# Altium footprint library 元件1.PcbLib: 420 footprints (part 11 of 27)
Each footprint in its own frame and in the unit in brackets; x right, y up, seen from the top. Pads: shape width x height; smd on the part's side, far side on the other; paste and mask are expansions set on the pad; w line width, h text height; cw(c..) or ccw(c..) is an arc to the next point about the centre after c.
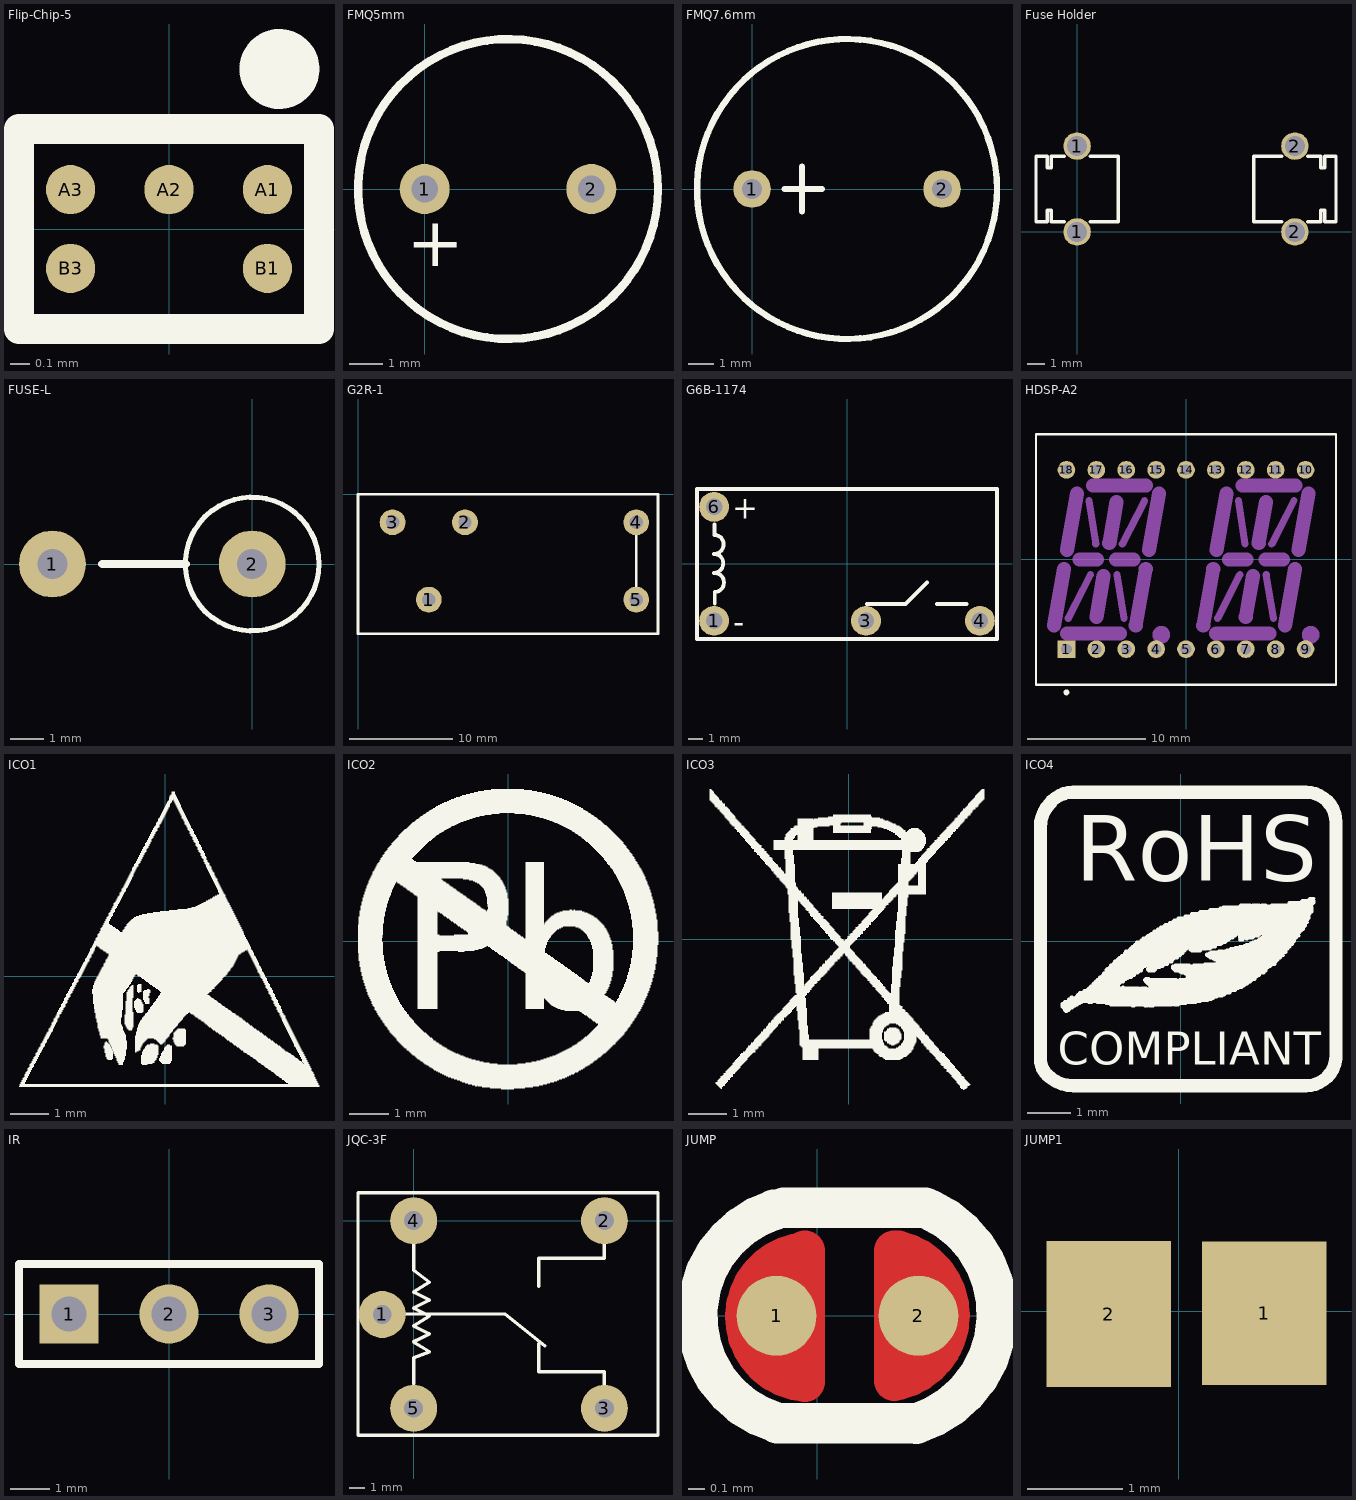
[diagram p10: the footprints below, top view; thin cyan lines are the x and y axes]

## Flip-Chip-5 [mm]
height 0.69
pads (5):
  round 0.25 smd mask+0.05: A1(0.5,0.2) A2(0,0.2) A3(-0.5,0.2) B1(0.5,-0.2) B3(-0.5,-0.2)
Top Overlay:
  circle w0.203: c0.561,0.813 r0.102
  lines w0.152: -0.762,-0.508 -0.762,0.508 0.762,0.508 0.762,-0.508 -0.762,-0.508
3D body "FlipChip-5.STEP": height 0.69, standoff 0, extent -0.693,-0.425 0.693,0.43

## FMQ5mm [mm]
pads (2):
  round 1.5 hole 0.8: 1(0,0) 2(5,0)
Top Overlay:
  circle w0.254: c2.5,0 r4.5
  text "+" at -0.533,-2.311 h1.5
3D body "cst-951ap.stp": height 4.5, standoff -4.5, extent -2,-4.5 7,4.5

## FMQ7.6mm [mm]
pads (2):
  round 1.5 hole 0.8: 1(0,0) 2(7.6,0)
Top Overlay:
  circle w0.254: c3.799,0 r6.001
  lines w0.254: 1.3,0 2.8,0 ; 2,-0.9 2,0.9
3D body "User Library-WST-1203UX.STEP": height 9.65, standoff -4.5, extent -5.727,-6 9.727,6

## Fuse Holder [mm]
pads (4):
  round 1.6 hole 1.17 mask+0.06: 1(0,0) 1(0,5) 2(12.7,0) 2(12.7,5)
Top Overlay:
  lines w0.2: -0.75,0.6 -1.5,0.6 -1.5,1.25 -1.75,1.25 -1.75,0.6 -2.4,0.6 -2.4,4.4 -1.75,4.4 -1.75,3.75 -1.5,3.75 -1.5,4.4 -0.75,4.4 ; 0.75,0.6 2.4,0.6 2.4,4.4 0.75,4.4 ; 11.95,0.6 10.3,0.6 10.3,4.4 11.95,4.4 ; 13.45,0.6 14.2,0.6 14.2,1.25 14.45,1.25 14.45,0.6 15.1,0.6 15.1,4.4 14.45,4.4 14.45,3.75 14.2,3.75 14.2,4.4 13.45,4.4
3D body "User Library-01110501Z.STEP": height 7.4, standoff -2.95, extent 10.325,0 15.125,5.1
3D body "User Library-01110501Z.STEP": height 7.4, standoff -2.95, extent -2.275,0 2.525,5.1

## FUSE-L [mil]
height 511.81
pads (2):
  round 79 hole 35.43: 1(-236.22,0) 2(0,0)
Top Overlay:
  circle w6: c0,0 r79
  lines w10: -177.17,0 -78.74,0
3D body "保险.": height 545.04, standoff -77.66, extent -249.02,-74.21 77.68,83.27

## G2R-1 [mm]
pads (5):
  round 2.5 hole 1.3: 1(6.858,-10.211) 2(10.363,-2.718) 3(3.353,-2.718) 4(26.949,-2.718) 5(26.949,-10.211)
Top Overlay:
  lines w0.254: 26.949,-10.211 26.949,-2.718 ; 0,-13.513 29.058,-13.513 29.058,0 0,0 0,-13.513
3D body "relay_g2rk-1_48dc.stp": height 25.5, standoff -4, extent 0.079,-13.583 29.08,-0.083

## G6B-1174 [mm]
pads (4):
  round 2 hole 1.1: 1(-8.89,-3.81) 3(1.27,-3.81) 4(8.89,-3.81) 6(-8.89,3.81)
Top Overlay:
  lines w0.254: -8.915,-0.61 ccw(c-8.915,0.025) -8.28,0.025 -8.28,0.051 ccw(c-8.89,0.051) -8.89,0.66 ccw(c-8.89,1.295) -8.255,1.295 -8.255,1.321 ccw(c-8.865,1.321) -8.865,1.93 -8.865,2.642 ; -8.865,-0.61 cw(c-8.865,-1.245) -8.23,-1.245 -8.23,-1.27 cw(c-8.839,-1.27) -8.839,-1.88 -8.839,-2.667 ; 1.346,-2.692 3.912,-2.692 5.359,-1.245 ; 6.02,-2.692 8.001,-2.692 ; -10.033,-5.029 10.033,-5.029 10.033,5.004 -10.033,5.004 -10.033,-5.029
  text "+" at -7.671,3.023 h1.52
  text "-" at -7.62,-4.648 h1.52
3D body "g6b-1114p-us_5dc.stp": height 10, standoff -3.2, extent -10.474,-5 10.526,5

## HDSP-A2 [mm] "LED, Alphanumeric Display, 13.8 mm, Dual Character; 18 Leads; Row Space 15.24 mm; Pitch 2.54 mm"
height 7.27
pads (18):
  rect 1.5x1.5 hole 0.9: 1(-10.16,-7.62)
  round 1.5 hole 0.9: 2(-7.62,-7.62) 3(-5.08,-7.62) 4(-2.54,-7.62) 5(0,-7.62) 6(2.54,-7.62) 7(5.08,-7.62) 8(7.62,-7.62) 9(10.16,-7.62) 10(10.16,7.62) 11(7.62,7.62) 12(5.08,7.62) 13(2.54,7.62) 14(0,7.62) 15(-2.54,7.62) 16(-5.08,7.62) 17(-7.62,7.62) 18(-10.16,7.62)
Top Overlay:
  circle w0.25: c-10.16,-11.3 r0.125
  lines w0.2: -12.75,-10.65 -12.75,10.65 12.75,10.65 12.75,-10.65 -12.75,-10.65
Mechanical 2:
  circle w1.2: c10.6,-6.4 r0.15
  circle w1.2: c-2.1,-6.4 r0.15
  lines w0.6: -10.01,-5 -8.12,-1.3 ; -8.25,5 -7.67,1.3 ; -5.88,-1.3 -5.28,-5 ; -5.42,1.3 -3.52,5 ; 2.69,-5 4.58,-1.3 ; 4.45,5 5.03,1.3 ; 6.82,-1.3 7.42,-5 ; 7.28,1.3 9.18,5
  lines w1.2: -11.23,-5.6 -10.38,-0.8 ; -10.13,-6.3 -5.62,-6.3 ; -10.1,0.8 -9.26,5.58 ; -9.035,0 -7.58,0 ; -7.9,6.3 -3.39,6.3 ; -7.62,-4.89 -7.01,-1.4 ; -6.52,1.41 -5.91,4.89 ; -5.96,0 -4.465,0 ; -4.27,-5.6 -3.42,-0.8 ; -3.13,0.81 -2.3,5.59 ; 1.47,-5.6 2.32,-0.8 ; 2.57,-6.3 7.08,-6.3 ; 2.6,0.8 3.44,5.58 ; 3.665,0 5.14,0 ; 4.8,6.3 9.31,6.3 ; 5.08,-4.89 5.69,-1.4 ; 6.18,1.41 6.79,4.89 ; 6.76,0 8.235,0 ; 8.43,-5.6 9.28,-0.8 ; 9.57,0.81 10.4,5.59
3D body "HDSP-A2.STEP": height 10, standoff 0, extent -12.164,-9.373 11.836,9.627

## ICO1 [mm]
Top Overlay:
  drawing of 990 lines, arcs and shapes, not listed

## ICO2 [mm]
Top Overlay:
  drawing of 960 lines, arcs and shapes, not listed

## ICO3 [mm]
Top Overlay:
  drawing of 1026 lines, arcs and shapes, not listed

## ICO4 [mm]
Top Overlay:
  drawing of 1541 lines, arcs and shapes, not listed
  text "COMPLIANT" at -2.845,-2.869 h0.76
  text "RoHS" at -2.438,1.398 h1.52

## IR [mm]
pads (3):
  rect 1.5x1.5 hole 0.9: 1(-2.54,0)
  round 1.5 hole 0.9: 2(0,0) 3(2.54,0)
Top Overlay:
  lines w0.2: -3.81,-1.27 -3.81,1.27 3.81,1.27 3.81,-1.27 -3.81,-1.27
3D body "User Library-IR reciver.STEP": height 10.48, standoff -2.63, extent -3.025,-3.997 2.975,3.789

## JQC-3F [mm]
pads (5):
  round 3 hole 1.2: 1(-2,-6) 2(12.2,0) 3(12.2,-12) 4(0,0) 5(0,-12)
Top Overlay:
  lines w0.22: -0.508,-5.969 5.842,-5.969 8.382,-8.001 ; 0,-10.414 0,-8.763 1.016,-8.382 0,-7.747 1.016,-7.239 0,-6.731 1.016,-6.096 0,-5.588 1.016,-5.08 0,-4.572 1.016,-3.937 0,-3.175 0,-1.524 ; 8.001,-7.874 8.001,-9.652 12.192,-9.652 12.192,-10.541 ; 8.001,-4.191 8.001,-2.413 12.192,-2.413 12.192,-1.524 ; -3.556,-13.716 -3.556,1.778 15.621,1.778 15.621,-13.716 -3.556,-13.716
3D body "User Library-SONGLE Relay SRU-12VDC-SL-C.STEP": height 15.3, standoff -5, extent -3.454,-13.722 15.646,1.778

## JUMP [mm]
pads (2):
  round 0.5 smd: 1(-0.254,0) 2(0.635,0)
Top Layer:
  lines w0.254: -0.129,0.39 ccw(c-0.043,-0.007) -0.077,-0.412 -0.076,0.406 ; 0.483,-0.406 0.483,0.406 ; 0.508,0.406 cw(c0.417,0.003) 0.51,-0.399
Top Overlay:
  lines w0.254: -0.272,0.663 ccw(c-0.054,-0.001) -0.259,-0.668 ; -0.249,-0.673 0.615,-0.673 ; -0.208,0.678 0.678,0.678 ; 0.62,-0.676 ccw(c0.409,0.011) 0.706,0.665
Top Solder:
  lines w1.143: -0.076,0 0.483,0

## JUMP1 [mm]
pads (2):
  rect 1.3x1.5 smd: 1(0.897,-0.023)
  rect 1.3x1.524 smd: 2(-0.73,-0.03)